# Altium schematic symbol library Capacitor - Ceramic - Sumsung.SchLib: 1421 symbols (part 6 of 8) (continued)
## CL31A475KBHNNNE (continued)
CAP CER 4.7UF 50V X5R 1206; Part Number: CL31A475KBHNNNE; Manufacturer: Samsung Electro-Mechanics America, Inc.; TemperatureRange: -55C ~ 85C; Tolerance: 10%; Value: 4.7uF; PartId: 17544; Supplier 1: Digi-Key; Supplier Part Number 1: 1276-3057-2-ND; ComponentLink1Description: Datasheet; ComponentLink1URL: //media.digikey.com/pdf/Data%20Sheets/Samsung%20PDFs/CL31A475KBHNNNE_Spec.pdf; ComponentLink2Description: Digi-Key Listing; ComponentLink2URL: https://www.digikey.com/product-detail/en/samsung-electro-mechanics-america-inc/CL31A475KBHNNNE/1276-3057-2-ND/3888715; TemperatureCoefficient: X5R; Voltage: 50V; Price: 0.1165; Device Package: 1206 (3216 Metric)
footprint CAP 1206/3216 - 1.8MM
pins: 1, 2

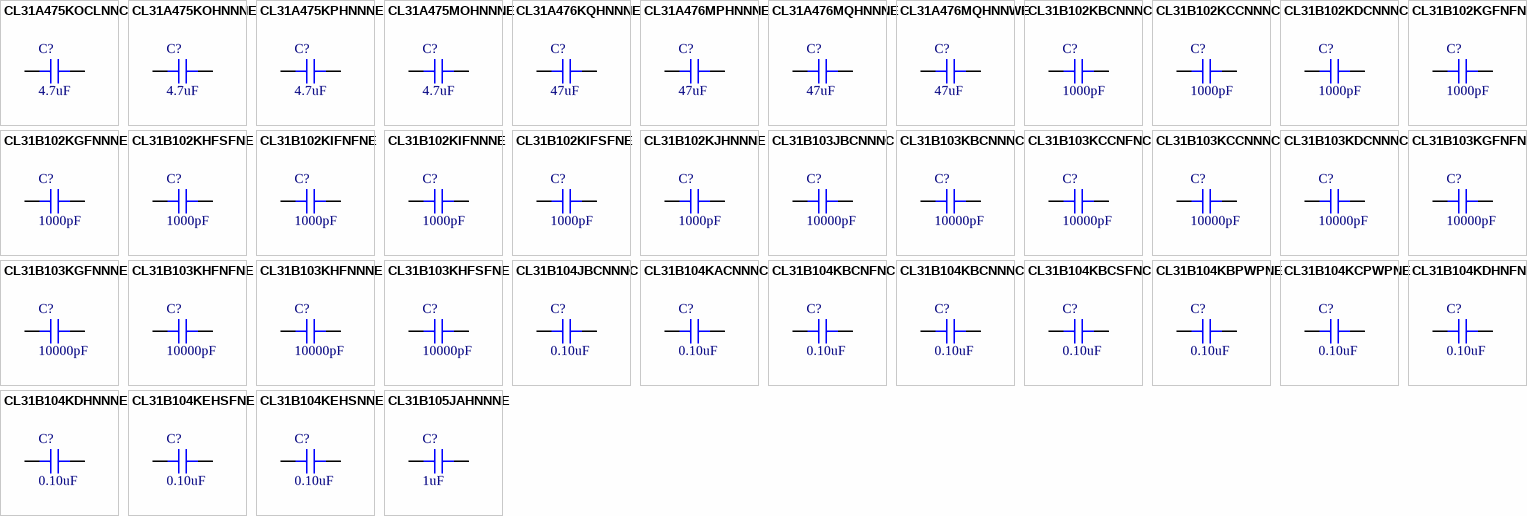
[diagram p25: symbols CL31A475KOCLNNC to CL31B105JAHNNNE]

## CL31A475KOCLNNC
designator C?, comment 4.7uF
CAP CER 4.7UF 16V X5R 1206; Part Number: CL31A475KOCLNNC; Manufacturer: Samsung Electro-Mechanics America, Inc.; TemperatureRange: -55C ~ 85C; Tolerance: 10%; Value: 4.7uF; PartId: 17212; Supplier 1: Digi-Key; Supplier Part Number 1: 1276-2733-2-ND; ComponentLink1Description: Datasheet; ComponentLink1URL: //media.digikey.com/pdf/Data%20Sheets/Samsung%20PDFs/CL31A475KOCLNNC_Spec.pdf; ComponentLink2Description: Digi-Key Listing; ComponentLink2URL: https://www.digikey.com/product-detail/en/samsung-electro-mechanics-america-inc/CL31A475KOCLNNC/1276-2733-2-ND/3888391; TemperatureCoefficient: X5R; Voltage: 16V; Price: 0.0779; Device Package: 1206 (3216 Metric)
footprint CAP 1206/3216 - 1.0MM
pins: 1, 2

## CL31A475KOHNNNE
designator C?, comment 4.7uF
CAP CER 4.7UF 16V X5R 1206; Part Number: CL31A475KOHNNNE; Manufacturer: Samsung Electro-Mechanics America, Inc.; TemperatureRange: -55C ~ 85C; Tolerance: 10%; Value: 4.7uF; PartId: 17565; Supplier 1: Digi-Key; Supplier Part Number 1: 1276-3059-2-ND; ComponentLink1Description: Datasheet; ComponentLink1URL: //media.digikey.com/pdf/Data%20Sheets/Samsung%20PDFs/CL31A475KOHNNNE_Spec.pdf; ComponentLink2Description: Digi-Key Listing; ComponentLink2URL: https://www.digikey.com/product-detail/en/samsung-electro-mechanics-america-inc/CL31A475KOHNNNE/1276-3059-2-ND/3888717; TemperatureCoefficient: X5R; Voltage: 16V; Price: 0.0695; Device Package: 1206 (3216 Metric)
footprint CAP 1206/3216 - 1.8MM
pins: 1, 2

## CL31A475KPHNNNE
designator C?, comment 4.7uF
CAP CER 4.7UF 10V X5R 1206; Part Number: CL31A475KPHNNNE; Manufacturer: Samsung Electro-Mechanics America, Inc.; TemperatureRange: -55C ~ 85C; Tolerance: 10%; Value: 4.7uF; PartId: 17670; Supplier 1: Digi-Key; Supplier Part Number 1: 1276-1809-2-ND; ComponentLink1Description: Datasheet; ComponentLink1URL: http://www.samsungsem.com/kr/front/downloadcms.do?path=/kr/support/product-search/mlcc/__icsFiles/afieldfile/2014/11/05&fileName=C_CL31A475KPHNNNE.pdf; ComponentLink2Description: Digi-Key Listing; ComponentLink2URL: https://www.digikey.com/product-detail/en/samsung-electro-mechanics-america-inc/CL31A475KPHNNNE/1276-1809-2-ND/3887467; TemperatureCoefficient: X5R; Voltage: 10V; Price: 0.0695; Device Package: 1206 (3216 Metric)
footprint CAP 1206/3216 - 1.8MM
pins: 1, 2

## CL31A475MOHNNNE
designator C?, comment 4.7uF
CAP CER 4.7UF 16V X5R 1206; Part Number: CL31A475MOHNNNE; Manufacturer: Samsung Electro-Mechanics America, Inc.; TemperatureRange: -55C ~ 85C; Tolerance: 20%; Value: 4.7uF; PartId: 17978; Supplier 1: Digi-Key; Supplier Part Number 1: 1276-3061-2-ND; ComponentLink1Description: Datasheet; ComponentLink1URL: //media.digikey.com/pdf/Data%20Sheets/Samsung%20PDFs/CL31A475MOHNNNE_Spec.pdf; ComponentLink2Description: Digi-Key Listing; ComponentLink2URL: https://www.digikey.com/product-detail/en/samsung-electro-mechanics-america-inc/CL31A475MOHNNNE/1276-3061-2-ND/3888719; TemperatureCoefficient: X5R; Voltage: 16V; Price: 0.0695; Device Package: 1206 (3216 Metric)
footprint CAP 1206/3216 - 1.8MM
pins: 1, 2

## CL31A476KQHNNNE
designator C?, comment 47uF
CAP CER 47UF 6.3V X5R 1206; Part Number: CL31A476KQHNNNE; Manufacturer: Samsung Electro-Mechanics America, Inc.; TemperatureRange: -55C ~ 85C; Tolerance: 10%; Value: 47uF; PartId: 15930; Supplier 1: Digi-Key; Supplier Part Number 1: 1276-3062-2-ND; ComponentLink1Description: Datasheet; ComponentLink1URL: //media.digikey.com/pdf/Data%20Sheets/Samsung%20PDFs/CL31A476KQHNNNE_Spec.pdf; ComponentLink2Description: Digi-Key Listing; ComponentLink2URL: https://www.digikey.com/product-detail/en/samsung-electro-mechanics-america-inc/CL31A476KQHNNNE/1276-3062-2-ND/3888720; TemperatureCoefficient: X5R; Voltage: 6.3V; Price: 0.3017; Device Package: 1206 (3216 Metric)
footprint CAP 1206/3216
pins: 1, 2

## CL31A476MPHNNNE
designator C?, comment 47uF
CAP CER 47UF 10V X5R 1206; Part Number: CL31A476MPHNNNE; Manufacturer: Samsung Electro-Mechanics America, Inc.; TemperatureRange: -55C ~ 85C; Tolerance: 20%; Value: 47uF; PartId: 15809; Supplier 1: Digi-Key; Supplier Part Number 1: 1276-3063-2-ND; ComponentLink1Description: Datasheet; ComponentLink1URL: //media.digikey.com/pdf/Data%20Sheets/Samsung%20PDFs/CL31A476MPHNNNE_Spec.pdf; ComponentLink2Description: Digi-Key Listing; ComponentLink2URL: https://www.digikey.com/product-detail/en/samsung-electro-mechanics-america-inc/CL31A476MPHNNNE/1276-3063-2-ND/3888721; TemperatureCoefficient: X5R; Voltage: 10V; Price: 0.2455; Device Package: 1206 (3216 Metric)
footprint CAP 1206/3216
pins: 1, 2

## CL31A476MQHNNNE
designator C?, comment 47uF
CAP CER 47UF 6.3V X5R 1206; Part Number: CL31A476MQHNNNE; Manufacturer: Samsung Electro-Mechanics America, Inc.; TemperatureRange: -55C ~ 85C; Tolerance: 20%; Value: 47uF; PartId: 15787; Supplier 1: Digi-Key; Supplier Part Number 1: 1276-1167-2-ND; ComponentLink1Description: Datasheet; ComponentLink1URL: http://www.samsungsem.com/kr/support/product-search/mlcc/CL31A476MQHNNNE.jsp; ComponentLink2Description: Digi-Key Listing; ComponentLink2URL: https://www.digikey.com/product-detail/en/samsung-electro-mechanics-america-inc/CL31A476MQHNNNE/1276-1167-2-ND/3886825; TemperatureCoefficient: X5R; Voltage: 6.3V; Price: 0.1643; Device Package: 1206 (3216 Metric)
footprint CAP 1206/3216
pins: 1, 2

## CL31A476MQHNNWE
designator C?, comment 47uF
CAP CER 47UF 6.3V X5R 1206; Part Number: CL31A476MQHNNWE; Manufacturer: Samsung Electro-Mechanics America, Inc.; TemperatureRange: -55C ~ 85C; Tolerance: 20%; Value: 47uF; PartId: 15984; Supplier 1: Digi-Key; Supplier Part Number 1: 1276-3064-2-ND; ComponentLink1Description: Datasheet; ComponentLink1URL: //media.digikey.com/pdf/Data%20Sheets/Samsung%20PDFs/CL31A476MQHNNWE_Spec.pdf; ComponentLink2Description: Digi-Key Listing; ComponentLink2URL: https://www.digikey.com/product-detail/en/samsung-electro-mechanics-america-inc/CL31A476MQHNNWE/1276-3064-2-ND/3888722; TemperatureCoefficient: X5R; Voltage: 6.3V; Price: 0.1643; Device Package: 1206 (3216 Metric)
footprint CAP 1206/3216
pins: 1, 2

## CL31B102KBCNNNC
designator C?, comment 1000pF
CAP CER 1000PF 50V X7R 1206; Part Number: CL31B102KBCNNNC; Manufacturer: Samsung Electro-Mechanics America, Inc.; TemperatureRange: -55C ~ 125C; Tolerance: 10%; Value: 1000pF; PartId: 16960; Supplier 1: Digi-Key; Supplier Part Number 1: 1276-1050-2-ND; ComponentLink1Description: Datasheet; ComponentLink1URL: http://www.samsungsem.com/kr/support/product-search/mlcc/__icsFiles/afieldfile/2016/08/18/S_CL31B102KBCNNNC.pdf; ComponentLink2Description: Digi-Key Listing; ComponentLink2URL: https://www.digikey.com/product-detail/en/samsung-electro-mechanics-america-inc/CL31B102KBCNNNC/1276-1050-2-ND/3886708; TemperatureCoefficient: X7R; Voltage: 50V; Price: 0.0293; Device Package: 1206 (3216 Metric)
footprint CAP 1206/3216 - 1.0MM
pins: 1, 2

## CL31B102KCCNNNC
designator C?, comment 1000pF
CAP CER 1000PF 100V X7R 1206; Part Number: CL31B102KCCNNNC; Manufacturer: Samsung Electro-Mechanics America, Inc.; TemperatureRange: -55C ~ 125C; Tolerance: 10%; Value: 1000pF; PartId: 17002; Supplier 1: Digi-Key; Supplier Part Number 1: 1276-1772-2-ND; ComponentLink1Description: Datasheet; ComponentLink1URL: http://www.samsungsem.com/kr/support/product-search/mlcc/__icsFiles/afieldfile/2016/08/18/S_CL31B102KCCNNNC.pdf; ComponentLink2Description: Digi-Key Listing; ComponentLink2URL: https://www.digikey.com/product-detail/en/samsung-electro-mechanics-america-inc/CL31B102KCCNNNC/1276-1772-2-ND/3887430; TemperatureCoefficient: X7R; Voltage: 100V; Price: 0.0441; Device Package: 1206 (3216 Metric)
footprint CAP 1206/3216 - 1.0MM
pins: 1, 2

## CL31B102KDCNNNC
designator C?, comment 1000pF
CAP CER 1000PF 200V X7R 1206; Part Number: CL31B102KDCNNNC; Manufacturer: Samsung Electro-Mechanics America, Inc.; TemperatureRange: -55C ~ 125C; Tolerance: 10%; Value: 1000pF; PartId: 15428; Supplier 1: Digi-Key; Supplier Part Number 1: 1276-2734-2-ND; ComponentLink1Description: Datasheet; ComponentLink1URL: //media.digikey.com/pdf/Data%20Sheets/Samsung%20PDFs/CL31B102KDCNNNC_Spec.pdf; ComponentLink2Description: Digi-Key Listing; ComponentLink2URL: https://www.digikey.com/product-detail/en/samsung-electro-mechanics-america-inc/CL31B102KDCNNNC/1276-2734-2-ND/3888392; TemperatureCoefficient: X7R; Voltage: 200V; Price: 0.0307; Device Package: 1206 (3216 Metric)
footprint CAP 1206/3216
pins: 1, 2

## CL31B102KGFNFNE
designator C?, comment 1000pF
CAP CER 1000PF 500V X7R 1206; Part Number: CL31B102KGFNFNE; Manufacturer: Samsung Electro-Mechanics America, Inc.; TemperatureRange: -55C ~ 125C; Tolerance: 10%; Value: 1000pF; PartId: 15403; Supplier 1: Digi-Key; Supplier Part Number 1: 1276-3065-2-ND; ComponentLink1Description: Datasheet; ComponentLink1URL: //media.digikey.com/pdf/Data%20Sheets/Samsung%20PDFs/CL31B102KGFNFNE_Spec.pdf; ComponentLink2Description: Digi-Key Listing; ComponentLink2URL: https://www.digikey.com/product-detail/en/samsung-electro-mechanics-america-inc/CL31B102KGFNFNE/1276-3065-2-ND/3888723; TemperatureCoefficient: X7R; Voltage: 500V; Price: 0.0336; Device Package: 1206 (3216 Metric)
footprint CAP 1206/3216
pins: 1, 2

## CL31B102KGFNNNE
designator C?, comment 1000pF
CAP CER 1000PF 500V X7R 1206; Part Number: CL31B102KGFNNNE; Manufacturer: Samsung Electro-Mechanics America, Inc.; TemperatureRange: -55C ~ 125C; Tolerance: 10%; Value: 1000pF; PartId: 15437; Supplier 1: Digi-Key; Supplier Part Number 1: 1276-3066-2-ND; ComponentLink1Description: Datasheet; ComponentLink1URL: //media.digikey.com/pdf/Data%20Sheets/Samsung%20PDFs/CL31B102KGFNNNE_Spec.pdf; ComponentLink2Description: Digi-Key Listing; ComponentLink2URL: https://www.digikey.com/product-detail/en/samsung-electro-mechanics-america-inc/CL31B102KGFNNNE/1276-3066-2-ND/3888724; TemperatureCoefficient: X7R; Voltage: 500V; Price: 0.0456; Device Package: 1206 (3216 Metric)
footprint CAP 1206/3216
pins: 1, 2

## CL31B102KHFSFNE
designator C?, comment 1000pF
CAP CER 1000PF 630V X7R 1206; Part Number: CL31B102KHFSFNE; Manufacturer: Samsung Electro-Mechanics America, Inc.; TemperatureRange: -55C ~ 125C; Tolerance: 10%; Value: 1000pF; PartId: 15508; Supplier 1: Digi-Key; Supplier Part Number 1: 1276-3069-2-ND; ComponentLink1Description: Datasheet; ComponentLink1URL: //media.digikey.com/pdf/Data%20Sheets/Samsung%20PDFs/CL31B102KHFSFNE_Spec.pdf; ComponentLink2Description: Digi-Key Listing; ComponentLink2URL: https://www.digikey.com/product-detail/en/samsung-electro-mechanics-america-inc/CL31B102KHFSFNE/1276-3069-2-ND/3888727; TemperatureCoefficient: X7R; Voltage: 630V; Price: 0.0336; Device Package: 1206 (3216 Metric)
footprint CAP 1206/3216
pins: 1, 2

## CL31B102KIFNFNE
designator C?, comment 1000pF
CAP CER 1000PF 1KV X7R 1206; Part Number: CL31B102KIFNFNE; Manufacturer: Samsung Electro-Mechanics America, Inc.; TemperatureRange: -55C ~ 125C; Tolerance: 10%; Voltage: 1000V (1kV); Value: 1000pF; PartId: 15465; Supplier 1: Digi-Key; Supplier Part Number 1: 1276-3070-2-ND; ComponentLink1Description: Datasheet; ComponentLink1URL: //media.digikey.com/pdf/Data%20Sheets/Samsung%20PDFs/CL31B102KIFNFNE_Spec.pdf; ComponentLink2Description: Digi-Key Listing; ComponentLink2URL: https://www.digikey.com/product-detail/en/samsung-electro-mechanics-america-inc/CL31B102KIFNFNE/1276-3070-2-ND/3888728; TemperatureCoefficient: X7R; Price: 0.0725; Device Package: 1206 (3216 Metric)
footprint CAP 1206/3216
pins: 1, 2

## CL31B102KIFNNNE
designator C?, comment 1000pF
CAP CER 1000PF 1KV X7R 1206; Part Number: CL31B102KIFNNNE; Manufacturer: Samsung Electro-Mechanics America, Inc.; TemperatureRange: -55C ~ 125C; Tolerance: 10%; Voltage: 1000V (1kV); Value: 1000pF; PartId: 15466; Supplier 1: Digi-Key; Supplier Part Number 1: 1276-3071-2-ND; ComponentLink1Description: Datasheet; ComponentLink1URL: //media.digikey.com/pdf/Data%20Sheets/Samsung%20PDFs/CL31B102KIFNNNE_Spec.pdf; ComponentLink2Description: Digi-Key Listing; ComponentLink2URL: https://www.digikey.com/product-detail/en/samsung-electro-mechanics-america-inc/CL31B102KIFNNNE/1276-3071-2-ND/3888729; TemperatureCoefficient: X7R; Price: 0.0725; Device Package: 1206 (3216 Metric)
footprint CAP 1206/3216
pins: 1, 2

## CL31B102KIFSFNE
designator C?, comment 1000pF
CAP CER 1000PF 1KV X7R 1206; Part Number: CL31B102KIFSFNE; Manufacturer: Samsung Electro-Mechanics America, Inc.; TemperatureRange: -55C ~ 125C; Tolerance: 10%; Voltage: 1000V (1kV); Value: 1000pF; PartId: 15502; Supplier 1: Digi-Key; Supplier Part Number 1: 1276-3072-2-ND; ComponentLink1Description: Datasheet; ComponentLink1URL: //media.digikey.com/pdf/Data%20Sheets/Samsung%20PDFs/CL31B102KIFSFNE_Spec.pdf; ComponentLink2Description: Digi-Key Listing; ComponentLink2URL: https://www.digikey.com/product-detail/en/samsung-electro-mechanics-america-inc/CL31B102KIFSFNE/1276-3072-2-ND/3888730; TemperatureCoefficient: X7R; Price: 0.0956; Device Package: 1206 (3216 Metric)
footprint CAP 1206/3216
pins: 1, 2

## CL31B102KJHNNNE
designator C?, comment 1000pF
CAP CER 1000PF 2KV X7R 1206; Part Number: CL31B102KJHNNNE; Manufacturer: Samsung Electro-Mechanics America, Inc.; TemperatureRange: -55C ~ 125C; Tolerance: 10%; Voltage: 2000V (2kV); Value: 1000pF; PartId: 15413; Supplier 1: Digi-Key; Supplier Part Number 1: 1276-3073-2-ND; ComponentLink1Description: Datasheet; ComponentLink1URL: //media.digikey.com/pdf/Data%20Sheets/Samsung%20PDFs/CL31B102KJHNNNE_Spec.pdf; ComponentLink2Description: Digi-Key Listing; ComponentLink2URL: https://www.digikey.com/product-detail/en/samsung-electro-mechanics-america-inc/CL31B102KJHNNNE/1276-3073-2-ND/3888731; TemperatureCoefficient: X7R; Price: 0.0675; Device Package: 1206 (3216 Metric)
footprint CAP 1206/3216
pins: 1, 2

## CL31B103JBCNNNC
designator C?, comment 10000pF
CAP CER 10000PF 50V X7R 1206; Part Number: CL31B103JBCNNNC; Manufacturer: Samsung Electro-Mechanics America, Inc.; TemperatureRange: -55C ~ 125C; Tolerance: 5%; Value: 10000pF; PartId: 17103; Supplier 1: Digi-Key; Supplier Part Number 1: 1276-2735-2-ND; ComponentLink1Description: Datasheet; ComponentLink1URL: http://www.samsungsem.com/kr/support/product-search/mlcc/__icsFiles/afieldfile/2016/08/18/S_CL31B103JBCNNNC.pdf; ComponentLink2Description: Digi-Key Listing; ComponentLink2URL: https://www.digikey.com/product-detail/en/samsung-electro-mechanics-america-inc/CL31B103JBCNNNC/1276-2735-2-ND/3888393; TemperatureCoefficient: X7R; Voltage: 50V; Price: 0.0451; Device Package: 1206 (3216 Metric)
footprint CAP 1206/3216 - 1.0MM
pins: 1, 2

## CL31B103KBCNNNC
designator C?, comment 10000pF
CAP CER 10000PF 50V X7R 1206; Part Number: CL31B103KBCNNNC; Manufacturer: Samsung Electro-Mechanics America, Inc.; TemperatureRange: -55C ~ 125C; Tolerance: 10%; Value: 10000pF; PartId: 16992; Supplier 1: Digi-Key; Supplier Part Number 1: 1276-1035-2-ND; ComponentLink1Description: Datasheet; ComponentLink1URL: http://www.samsungsem.com/kr/support/product-search/mlcc/__icsFiles/afieldfile/2016/08/18/S_CL31B103KBCNNNC.pdf; ComponentLink2Description: Digi-Key Listing; ComponentLink2URL: https://www.digikey.com/product-detail/en/samsung-electro-mechanics-america-inc/CL31B103KBCNNNC/1276-1035-2-ND/3886693; TemperatureCoefficient: X7R; Voltage: 50V; Price: 0.0249; Device Package: 1206 (3216 Metric)
footprint CAP 1206/3216 - 1.0MM
pins: 1, 2

## CL31B103KCCNFNC
designator C?, comment 10000pF
CAP CER 10000PF 100V X7R 1206; Part Number: CL31B103KCCNFNC; Manufacturer: Samsung Electro-Mechanics America, Inc.; TemperatureRange: -55C ~ 125C; Tolerance: 10%; Value: 10000pF; PartId: 17285; Supplier 1: Digi-Key; Supplier Part Number 1: 1276-2738-2-ND; ComponentLink1Description: Datasheet; ComponentLink1URL: http://www.samsungsem.com/kr/front/downloadcms.do?path=/kr/support/product-search/mlcc/__icsFiles/afieldfile/2014/11/05&fileName=C_CL31B103KCCNFNC.pdf; ComponentLink2Description: Digi-Key Listing; ComponentLink2URL: https://www.digikey.com/product-detail/en/samsung-electro-mechanics-america-inc/CL31B103KCCNFNC/1276-2738-2-ND/3888396; TemperatureCoefficient: X7R; Voltage: 100V; Price: 0.0388; Device Package: 1206 (3216 Metric)
footprint CAP 1206/3216 - 1.0MM
pins: 1, 2

## CL31B103KCCNNNC
designator C?, comment 10000pF
CAP CER 10000PF 100V X7R 1206; Part Number: CL31B103KCCNNNC; Manufacturer: Samsung Electro-Mechanics America, Inc.; TemperatureRange: -55C ~ 125C; Tolerance: 10%; Value: 10000pF; PartId: 17010; Supplier 1: Digi-Key; Supplier Part Number 1: 1276-1157-2-ND; ComponentLink1Description: Datasheet; ComponentLink1URL: http://www.samsungsem.com/kr/front/downloadcms.do?path=/kr/support/product-search/mlcc/__icsFiles/afieldfile/2014/11/05&fileName=C_CL31B103KCCNNNC.pdf; ComponentLink2Description: Digi-Key Listing; ComponentLink2URL: https://www.digikey.com/product-detail/en/samsung-electro-mechanics-america-inc/CL31B103KCCNNNC/1276-1157-2-ND/3886815; TemperatureCoefficient: X7R; Voltage: 100V; Price: 0.0388; Device Package: 1206 (3216 Metric)
footprint CAP 1206/3216 - 1.0MM
pins: 1, 2

## CL31B103KDCNNNC
designator C?, comment 10000pF
CAP CER 10000PF 200V X7R 1206; Part Number: CL31B103KDCNNNC; Manufacturer: Samsung Electro-Mechanics America, Inc.; TemperatureRange: -55C ~ 125C; Tolerance: 10%; Value: 10000pF; PartId: 17153; Supplier 1: Digi-Key; Supplier Part Number 1: 1276-2739-2-ND; ComponentLink1Description: Datasheet; ComponentLink1URL: //media.digikey.com/pdf/Data%20Sheets/Samsung%20PDFs/CL31B103KDCNNNC_Spec.pdf; ComponentLink2Description: Digi-Key Listing; ComponentLink2URL: https://www.digikey.com/product-detail/en/samsung-electro-mechanics-america-inc/CL31B103KDCNNNC/1276-2739-2-ND/3888397; TemperatureCoefficient: X7R; Voltage: 200V; Price: 0.0688; Device Package: 1206 (3216 Metric)
footprint CAP 1206/3216 - 1.0MM
pins: 1, 2

## CL31B103KGFNFNE
designator C?, comment 10000pF
CAP CER 10000PF 500V X7R 1206; Part Number: CL31B103KGFNFNE; Manufacturer: Samsung Electro-Mechanics America, Inc.; TemperatureRange: -55C ~ 125C; Tolerance: 10%; Value: 10000pF; PartId: 15446; Supplier 1: Digi-Key; Supplier Part Number 1: 1276-3075-2-ND; ComponentLink1Description: Datasheet; ComponentLink1URL: //media.digikey.com/pdf/Data%20Sheets/Samsung%20PDFs/CL31B103KGFNFNE_Spec.pdf; ComponentLink2Description: Digi-Key Listing; ComponentLink2URL: https://www.digikey.com/product-detail/en/samsung-electro-mechanics-america-inc/CL31B103KGFNFNE/1276-3075-2-ND/3888733; TemperatureCoefficient: X7R; Voltage: 500V; Price: 0.0545; Device Package: 1206 (3216 Metric)
footprint CAP 1206/3216
pins: 1, 2

## CL31B103KGFNNNE
designator C?, comment 10000pF
CAP CER 10000PF 500V X7R 1206; Part Number: CL31B103KGFNNNE; Manufacturer: Samsung Electro-Mechanics America, Inc.; TemperatureRange: -55C ~ 125C; Tolerance: 10%; Value: 10000pF; PartId: 15407; Supplier 1: Digi-Key; Supplier Part Number 1: 1276-3076-2-ND; ComponentLink1Description: Datasheet; ComponentLink1URL: //media.digikey.com/pdf/Data%20Sheets/Samsung%20PDFs/CL31B103KGFNNNE_Spec.pdf; ComponentLink2Description: Digi-Key Listing; ComponentLink2URL: https://www.digikey.com/product-detail/en/samsung-electro-mechanics-america-inc/CL31B103KGFNNNE/1276-3076-2-ND/3888734; TemperatureCoefficient: X7R; Voltage: 500V; Price: 0.0545; Device Package: 1206 (3216 Metric)
footprint CAP 1206/3216
pins: 1, 2

## CL31B103KHFNFNE
designator C?, comment 10000pF
CAP CER 10000PF 630V X7R 1206; Part Number: CL31B103KHFNFNE; Manufacturer: Samsung Electro-Mechanics America, Inc.; TemperatureRange: -55C ~ 125C; Tolerance: 10%; Value: 10000pF; PartId: 15506; Supplier 1: Digi-Key; Supplier Part Number 1: 1276-3077-2-ND; ComponentLink1Description: Datasheet; ComponentLink1URL: //media.digikey.com/pdf/Data%20Sheets/Samsung%20PDFs/CL31B103KHFNFNE_Spec.pdf; ComponentLink2Description: Digi-Key Listing; ComponentLink2URL: https://www.digikey.com/product-detail/en/samsung-electro-mechanics-america-inc/CL31B103KHFNFNE/1276-3077-2-ND/3888735; TemperatureCoefficient: X7R; Voltage: 630V; Price: 0.0507; Device Package: 1206 (3216 Metric)
footprint CAP 1206/3216
pins: 1, 2

## CL31B103KHFNNNE
designator C?, comment 10000pF
CAP CER 10000PF 630V X7R 1206; Part Number: CL31B103KHFNNNE; Manufacturer: Samsung Electro-Mechanics America, Inc.; TemperatureRange: -55C ~ 125C; Tolerance: 10%; Value: 10000pF; PartId: 15444; Supplier 1: Digi-Key; Supplier Part Number 1: 1276-3078-2-ND; ComponentLink1Description: Datasheet; ComponentLink1URL: //media.digikey.com/pdf/Data%20Sheets/Samsung%20PDFs/CL31B103KHFNNNE_Spec.pdf; ComponentLink2Description: Digi-Key Listing; ComponentLink2URL: https://www.digikey.com/product-detail/en/samsung-electro-mechanics-america-inc/CL31B103KHFNNNE/1276-3078-2-ND/3888736; TemperatureCoefficient: X7R; Voltage: 630V; Price: 0.054; Device Package: 1206 (3216 Metric)
footprint CAP 1206/3216
pins: 1, 2

## CL31B103KHFSFNE
designator C?, comment 10000pF
CAP CER 10000PF 630V X7R 1206; Part Number: CL31B103KHFSFNE; Manufacturer: Samsung Electro-Mechanics America, Inc.; TemperatureRange: -55C ~ 125C; Tolerance: 10%; Value: 10000pF; PartId: 15442; Supplier 1: Digi-Key; Supplier Part Number 1: 1276-3079-2-ND; ComponentLink1Description: Datasheet; ComponentLink1URL: //media.digikey.com/pdf/Data%20Sheets/Samsung%20PDFs/CL31B103KHFSFNE_Spec.pdf; ComponentLink2Description: Digi-Key Listing; ComponentLink2URL: https://www.digikey.com/product-detail/en/samsung-electro-mechanics-america-inc/CL31B103KHFSFNE/1276-3079-2-ND/3888737; TemperatureCoefficient: X7R; Voltage: 630V; Price: 0.054; Device Package: 1206 (3216 Metric)
footprint CAP 1206/3216
pins: 1, 2

## CL31B104JBCNNNC
designator C?, comment 0.10uF
CAP CER 0.1UF 50V X7R 1206; Part Number: CL31B104JBCNNNC; Manufacturer: Samsung Electro-Mechanics America, Inc.; TemperatureRange: -55C ~ 125C; Tolerance: 5%; Value: 0.10uF; PartId: 16969; Supplier 1: Digi-Key; Supplier Part Number 1: 1276-1165-2-ND; ComponentLink1Description: Datasheet; ComponentLink1URL: http://www.samsungsem.com/kr/support/product-search/mlcc/__icsFiles/afieldfile/2016/08/18/S_CL31B104JBCNNNC.pdf; ComponentLink2Description: Digi-Key Listing; ComponentLink2URL: https://www.digikey.com/product-detail/en/samsung-electro-mechanics-america-inc/CL31B104JBCNNNC/1276-1165-2-ND/3886823; TemperatureCoefficient: X7R; Voltage: 50V; Price: 0.0384; Device Package: 1206 (3216 Metric)
footprint CAP 1206/3216 - 1.0MM
pins: 1, 2

## CL31B104KACNNNC
designator C?, comment 0.10uF
CAP CER 0.1UF 25V X7R 1206; Part Number: CL31B104KACNNNC; Manufacturer: Samsung Electro-Mechanics America, Inc.; TemperatureRange: -55C ~ 125C; Tolerance: 10%; Value: 0.10uF; PartId: 16984; Supplier 1: Digi-Key; Supplier Part Number 1: 1276-2742-2-ND; ComponentLink1Description: Datasheet; ComponentLink1URL: http://www.samsungsem.com/kr/support/product-search/mlcc/__icsFiles/afieldfile/2016/08/18/S_CL31B104KACNNNC.pdf; ComponentLink2Description: Digi-Key Listing; ComponentLink2URL: https://www.digikey.com/product-detail/en/samsung-electro-mechanics-america-inc/CL31B104KACNNNC/1276-2742-2-ND/3888400; TemperatureCoefficient: X7R; Voltage: 25V; Price: 0.0207; Device Package: 1206 (3216 Metric)
footprint CAP 1206/3216 - 1.0MM
pins: 1, 2

## CL31B104KBCNFNC
designator C?, comment 0.10uF
CAP CER 0.1UF 50V X7R 1206; Part Number: CL31B104KBCNFNC; Manufacturer: Samsung Electro-Mechanics America, Inc.; TemperatureRange: -55C ~ 125C; Tolerance: 10%; Value: 0.10uF; PartId: 17296; Supplier 1: Digi-Key; Supplier Part Number 1: 1276-2744-2-ND; ComponentLink1Description: Datasheet; ComponentLink1URL: http://www.samsungsem.com/kr/support/product-search/mlcc/__icsFiles/afieldfile/2016/08/18/S_CL31B104KBCNFNC.pdf; ComponentLink2Description: Digi-Key Listing; ComponentLink2URL: https://www.digikey.com/product-detail/en/samsung-electro-mechanics-america-inc/CL31B104KBCNFNC/1276-2744-2-ND/3888402; TemperatureCoefficient: X7R; Voltage: 50V; Price: 0.0217; Device Package: 1206 (3216 Metric)
footprint CAP 1206/3216 - 1.0MM
pins: 1, 2

## CL31B104KBCNNNC
designator C?, comment 0.10uF
CAP CER 0.1UF 50V X7R 1206; Part Number: CL31B104KBCNNNC; Manufacturer: Samsung Electro-Mechanics America, Inc.; TemperatureRange: -55C ~ 125C; Tolerance: 10%; Value: 0.10uF; PartId: 16950; Supplier 1: Digi-Key; Supplier Part Number 1: 1276-1017-2-ND; ComponentLink1Description: Datasheet; ComponentLink1URL: http://www.samsungsem.com/kr/support/product-search/mlcc/__icsFiles/afieldfile/2016/08/18/S_CL31B104KBCNNNC.pdf; ComponentLink2Description: Digi-Key Listing; ComponentLink2URL: https://www.digikey.com/product-detail/en/samsung-electro-mechanics-america-inc/CL31B104KBCNNNC/1276-1017-2-ND/3886675; TemperatureCoefficient: X7R; Voltage: 50V; Price: 0.0207; Device Package: 1206 (3216 Metric)
footprint CAP 1206/3216 - 1.0MM
pins: 1, 2

## CL31B104KBCSFNC
designator C?, comment 0.10uF
CAP CER 0.1UF 50V X7R 1206; Part Number: CL31B104KBCSFNC; Manufacturer: Samsung Electro-Mechanics America, Inc.; TemperatureRange: -55C ~ 125C; Tolerance: 10%; Value: 0.10uF; PartId: 17293; Supplier 1: Digi-Key; Supplier Part Number 1: 1276-2745-2-ND; ComponentLink1Description: Datasheet; ComponentLink1URL: //media.digikey.com/pdf/Data%20Sheets/Samsung%20PDFs/MLCC_Catalog_2015.pdf; ComponentLink2Description: Digi-Key Listing; ComponentLink2URL: https://www.digikey.com/product-detail/en/samsung-electro-mechanics-america-inc/CL31B104KBCSFNC/1276-2745-2-ND/3888403; TemperatureCoefficient: X7R; Voltage: 50V; Price: 0.0306; Device Package: 1206 (3216 Metric)
footprint CAP 1206/3216 - 1.0MM
pins: 1, 2

## CL31B104KBPWPNE
designator C?, comment 0.10uF
CAP CER 0.1UF 50V X7R 1206; Part Number: CL31B104KBPWPNE; Manufacturer: Samsung Electro-Mechanics America, Inc.; TemperatureRange: -55C ~ 125C; Tolerance: 10%; Value: 0.10uF; PartId: 17751; Supplier 1: Digi-Key; Supplier Part Number 1: 1276-6731-2-ND; ComponentLink1Description: Datasheet; ComponentLink1URL: //media.digikey.com/pdf/Data%20Sheets/Samsung%20PDFs/MLCC_Catalog_2015.pdf; ComponentLink2Description: Digi-Key Listing; ComponentLink2URL: https://www.digikey.com/product-detail/en/samsung-electro-mechanics-america-inc/CL31B104KBPWPNE/1276-6731-2-ND/5961215; TemperatureCoefficient: X7R; Voltage: 50V; Price: 0.0975; Device Package: 1206 (3216 Metric)
footprint CAP 1206/3216 - 1.8MM
pins: 1, 2

## CL31B104KCPWPNE
designator C?, comment 0.10uF
CAP CER 0.1UF 100V X7R 1206; Part Number: CL31B104KCPWPNE; Manufacturer: Samsung Electro-Mechanics America, Inc.; TemperatureRange: -55C ~ 125C; Tolerance: 10%; Value: 0.10uF; PartId: 17765; Supplier 1: Digi-Key; Supplier Part Number 1: 1276-6634-2-ND; ComponentLink1Description: Datasheet; ComponentLink1URL: //media.digikey.com/pdf/Data%20Sheets/Samsung%20PDFs/MLCC_Catalog_2015.pdf; ComponentLink2Description: Digi-Key Listing; ComponentLink2URL: https://www.digikey.com/product-detail/en/samsung-electro-mechanics-america-inc/CL31B104KCPWPNE/1276-6634-2-ND/5961118; TemperatureCoefficient: X7R; Voltage: 100V; Price: 0.0521; Device Package: 1206 (3216 Metric)
footprint CAP 1206/3216 - 1.8MM
pins: 1, 2

## CL31B104KDHNFNE
designator C?, comment 0.10uF
CAP CER 0.1UF 200V X7R 1206; Part Number: CL31B104KDHNFNE; Manufacturer: Samsung Electro-Mechanics America, Inc.; TemperatureRange: -55C ~ 125C; Tolerance: 10%; Value: 0.10uF; PartId: 15416; Supplier 1: Digi-Key; Supplier Part Number 1: 1276-3081-2-ND; ComponentLink1Description: Datasheet; ComponentLink1URL: //media.digikey.com/pdf/Data%20Sheets/Samsung%20PDFs/CL31B104KDHNFNE_Character.pdf; ComponentLink2Description: Digi-Key Listing; ComponentLink2URL: https://www.digikey.com/product-detail/en/samsung-electro-mechanics-america-inc/CL31B104KDHNFNE/1276-3081-2-ND/3888739; TemperatureCoefficient: X7R; Voltage: 200V; Price: 0.07; Device Package: 1206 (3216 Metric)
footprint CAP 1206/3216
pins: 1, 2

## CL31B104KDHNNNE
designator C?, comment 0.10uF
CAP CER 0.1UF 200V X7R 1206; Part Number: CL31B104KDHNNNE; Manufacturer: Samsung Electro-Mechanics America, Inc.; TemperatureRange: -55C ~ 125C; Tolerance: 10%; Value: 0.10uF; PartId: 15415; Supplier 1: Digi-Key; Supplier Part Number 1: 1276-3082-2-ND; ComponentLink1Description: Datasheet; ComponentLink1URL: //media.digikey.com/pdf/Data%20Sheets/Samsung%20PDFs/CL31B104KDHNNNE_Spec.pdf; ComponentLink2Description: Digi-Key Listing; ComponentLink2URL: https://www.digikey.com/product-detail/en/samsung-electro-mechanics-america-inc/CL31B104KDHNNNE/1276-3082-2-ND/3888740; TemperatureCoefficient: X7R; Voltage: 200V; Price: 0.07; Device Package: 1206 (3216 Metric)
footprint CAP 1206/3216
pins: 1, 2

## CL31B104KEHSFNE
designator C?, comment 0.10uF
CAP CER 0.1UF 250V X7R 1206; Part Number: CL31B104KEHSFNE; Manufacturer: Samsung Electro-Mechanics America, Inc.; TemperatureRange: -55C ~ 125C; Tolerance: 10%; Value: 0.10uF; PartId: 15417; Supplier 1: Digi-Key; Supplier Part Number 1: 1276-3083-2-ND; ComponentLink1Description: Datasheet; ComponentLink1URL: //media.digikey.com/pdf/Data%20Sheets/Samsung%20PDFs/CL31B104KEHSFNE_Spec.pdf; ComponentLink2Description: Digi-Key Listing; ComponentLink2URL: https://www.digikey.com/product-detail/en/samsung-electro-mechanics-america-inc/CL31B104KEHSFNE/1276-3083-2-ND/3888741; TemperatureCoefficient: X7R; Voltage: 250V; Price: 0.07; Device Package: 1206 (3216 Metric)
footprint CAP 1206/3216
pins: 1, 2

## CL31B104KEHSNNE
designator C?, comment 0.10uF
CAP CER 0.1UF 250V X7R 1206; Part Number: CL31B104KEHSNNE; Manufacturer: Samsung Electro-Mechanics America, Inc.; TemperatureRange: -55C ~ 125C; Tolerance: 10%; Value: 0.10uF; PartId: 15414; Supplier 1: Digi-Key; Supplier Part Number 1: 1276-3084-2-ND; ComponentLink1Description: Datasheet; ComponentLink1URL: //media.digikey.com/pdf/Data%20Sheets/Samsung%20PDFs/CL31B104KEHSNNE_Spec.pdf; ComponentLink2Description: Digi-Key Listing; ComponentLink2URL: https://www.digikey.com/product-detail/en/samsung-electro-mechanics-america-inc/CL31B104KEHSNNE/1276-3084-2-ND/3888742; TemperatureCoefficient: X7R; Voltage: 250V; Price: 0.07; Device Package: 1206 (3216 Metric)
footprint CAP 1206/3216
pins: 1, 2

## CL31B105JAHNNNE
designator C?, comment 1uF
CAP CER 1UF 25V X7R 1206; Part Number: CL31B105JAHNNNE; Manufacturer: Samsung Electro-Mechanics America, Inc.; TemperatureRange: -55C ~ 125C; Tolerance: 5%; Value: 1uF; PartId: 6203; Supplier 1: Digi-Key; Supplier Part Number 1: 1276-3085-2-ND; ComponentLink1Description: Datasheet; ComponentLink1URL: http://www.samsungsem.com/kr/support/product-search/mlcc/CL31B105JAHNNNE.jsp; ComponentLink2Description: Digi-Key listing; ComponentLink2URL: http://digikey.com/product-detail/en/CL31B105JAHNNNE/1276-3085-2-ND/3888743; TemperatureCoefficient: X7R; Voltage: 25V; Price: 0.1129; Type: -; Device Package: 1206 (3216 Metric)
footprint CAP 1206/3216
pins: 1, 2

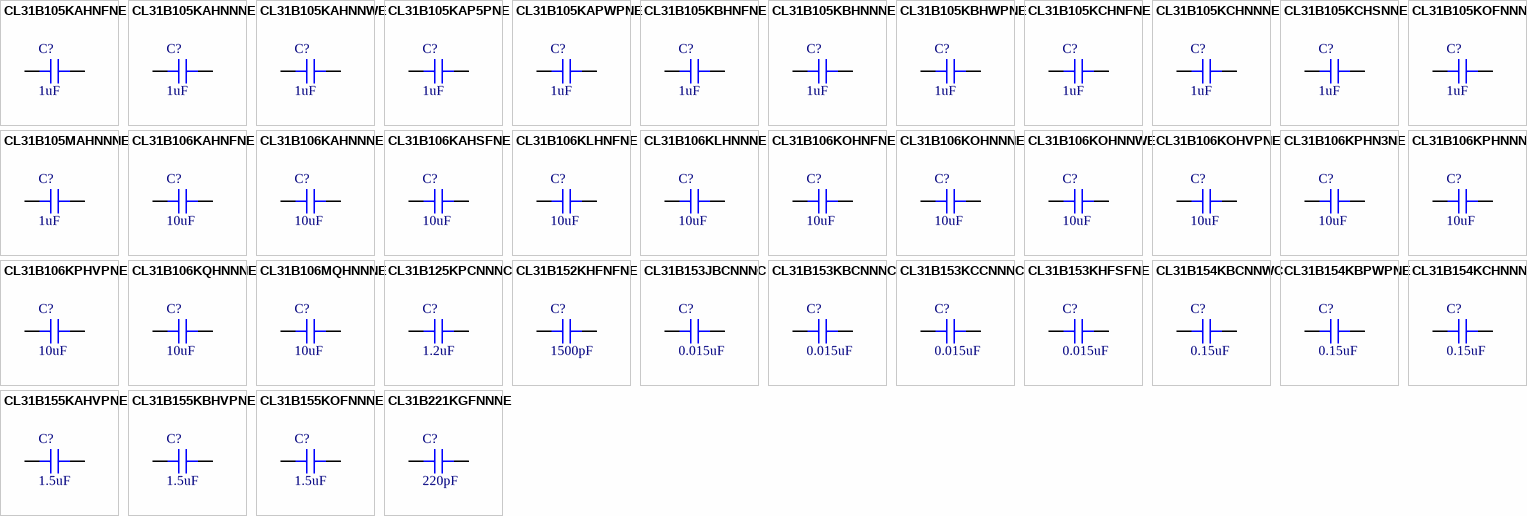
[diagram p26: symbols CL31B105KAHNFNE to CL31B221KGFNNNE]

## CL31B105KAHNFNE
designator C?, comment 1uF
CAP CER 1UF 25V X7R 1206; Part Number: CL31B105KAHNFNE; Manufacturer: Samsung Electro-Mechanics America, Inc.; TemperatureRange: -55C ~ 125C; Tolerance: 10%; Value: 1uF; PartId: 17698; Supplier 1: Digi-Key; Supplier Part Number 1: 1276-3086-2-ND; ComponentLink1Description: Datasheet; ComponentLink1URL: http://www.samsungsem.com/kr/support/product-search/mlcc/__icsFiles/afieldfile/2016/08/18/S_CL31B105KAHNFNE.pdf; ComponentLink2Description: Digi-Key Listing; ComponentLink2URL: https://www.digikey.com/product-detail/en/samsung-electro-mechanics-america-inc/CL31B105KAHNFNE/1276-3086-2-ND/3888744; TemperatureCoefficient: X7R; Voltage: 25V; Price: 0.0398; Device Package: 1206 (3216 Metric)
footprint CAP 1206/3216 - 1.8MM
pins: 1, 2

## CL31B105KAHNNNE
designator C?, comment 1uF
CAP CER 1UF 25V X7R 1206; Part Number: CL31B105KAHNNNE; Manufacturer: Samsung Electro-Mechanics America, Inc.; TemperatureRange: -55C ~ 125C; Tolerance: 10%; Value: 1uF; PartId: 17388; Supplier 1: Digi-Key; Supplier Part Number 1: 1276-1097-2-ND; ComponentLink1Description: Datasheet; ComponentLink1URL: http://www.samsungsem.com/kr/support/product-search/mlcc/__icsFiles/afieldfile/2016/08/18/S_CL31B105KAHNNNE.pdf; ComponentLink2Description: Digi-Key Listing; ComponentLink2URL: https://www.digikey.com/product-detail/en/samsung-electro-mechanics-america-inc/CL31B105KAHNNNE/1276-1097-2-ND/3886755; TemperatureCoefficient: X7R; Voltage: 25V; Price: 0.0398; Device Package: 1206 (3216 Metric)
footprint CAP 1206/3216 - 1.8MM
pins: 1, 2

## CL31B105KAHNNWE
designator C?, comment 1uF
CAP CER 1UF 25V X7R 1206; Part Number: CL31B105KAHNNWE; Manufacturer: Samsung Electro-Mechanics America, Inc.; TemperatureRange: -55C ~ 125C; Tolerance: 10%; Value: 1uF; PartId: 17700; Supplier 1: Digi-Key; Supplier Part Number 1: 1276-3087-2-ND; ComponentLink1Description: Datasheet; ComponentLink1URL: http://www.samsungsem.com/kr/support/product-search/mlcc/__icsFiles/afieldfile/2016/08/18/S_CL31B105KAHNNWE.pdf; ComponentLink2Description: Digi-Key Listing; ComponentLink2URL: https://www.digikey.com/product-detail/en/samsung-electro-mechanics-america-inc/CL31B105KAHNNWE/1276-3087-2-ND/3888745; TemperatureCoefficient: X7R; Voltage: 25V; Price: 0.0398; Device Package: 1206 (3216 Metric)
footprint CAP 1206/3216 - 1.8MM
pins: 1, 2

## CL31B105KAP5PNE
designator C?, comment 1uF
CAP CER 1UF 25V X7R 1206; Part Number: CL31B105KAP5PNE; Manufacturer: Samsung Electro-Mechanics America, Inc.; TemperatureRange: -55C ~ 125C; Tolerance: 10%; Type: Open Mode, Soft Termination; Value: 1uF; PartId: 6175; Supplier 1: Digi-Key; Supplier Part Number 1: 1276-3088-2-ND; ComponentLink1Description: Datasheet; ComponentLink1URL: http://media.digikey.com/pdf/Data%20Sheets/Samsung%20PDFs/CL31B105KAP5PNE_Spec.pdf; ComponentLink2Description: Digi-Key listing; ComponentLink2URL: http://digikey.com/product-detail/en/CL31B105KAP5PNE/1276-3088-2-ND/3888746; TemperatureCoefficient: X7R; Voltage: 25V; Price: 0.0663; Device Package: 1206 (3216 Metric)
footprint CAP 1206/3216
pins: 1, 2

## CL31B105KAPWPNE
designator C?, comment 1uF
CAP CER 1UF 25V X7R 1206; Part Number: CL31B105KAPWPNE; Manufacturer: Samsung Electro-Mechanics America, Inc.; TemperatureRange: -55C ~ 125C; Tolerance: 10%; Value: 1uF; PartId: 17756; Supplier 1: Digi-Key; Supplier Part Number 1: 1276-6712-2-ND; ComponentLink1Description: Datasheet; ComponentLink1URL: //media.digikey.com/pdf/Data%20Sheets/Samsung%20PDFs/MLCC_Catalog_2015.pdf; ComponentLink2Description: Digi-Key Listing; ComponentLink2URL: https://www.digikey.com/product-detail/en/samsung-electro-mechanics-america-inc/CL31B105KAPWPNE/1276-6712-2-ND/5961196; TemperatureCoefficient: X7R; Voltage: 25V; Price: 0.0851; Device Package: 1206 (3216 Metric)
footprint CAP 1206/3216 - 1.8MM
pins: 1, 2

## CL31B105KBHNFNE
designator C?, comment 1uF